# Altium footprint library std-th.PcbLib: 245 footprints (part 16 of 16)
Each footprint in its own frame and in the unit in brackets; x right, y up, seen from the top. Pads: shape width x height; smd on the part's side, far side on the other; paste and mask are expansions set on the pad; w line width, h text height; cw(c..) or ccw(c..) is an arc to the next point about the centre after c.
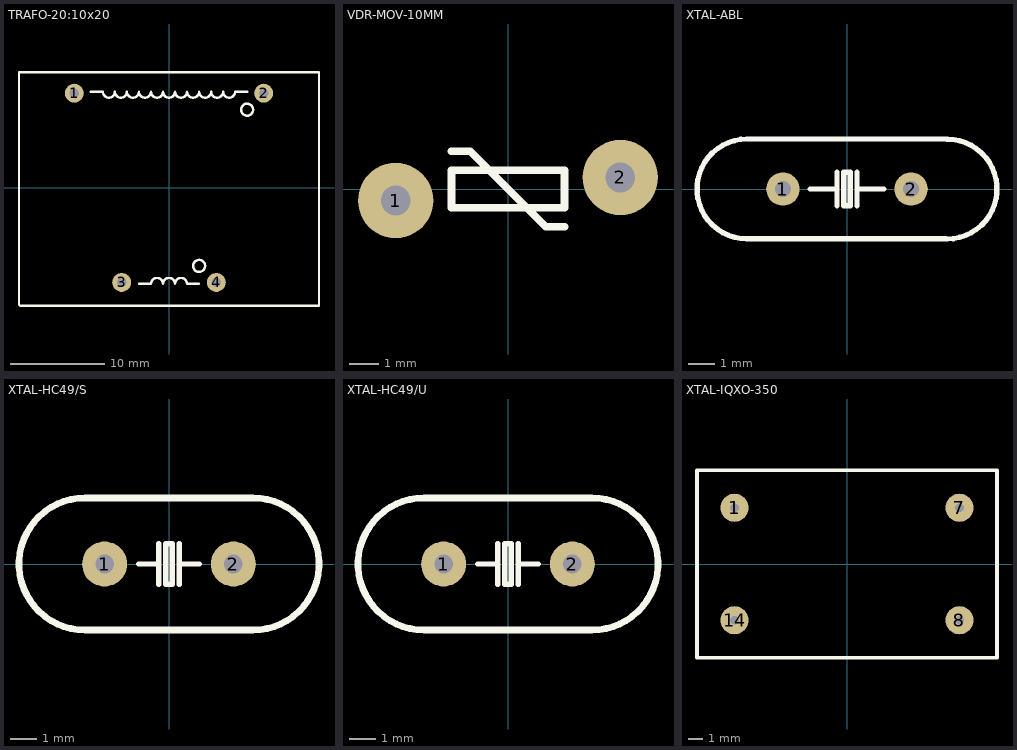
[diagram p15: the footprints below, top view; thin cyan lines are the x and y axes]

## TRAFO-20:10x20 [mm] "Transformer, body 31.7 x 26.7 x 21.8 mm, prim leads 20 mm; sec leads 10 mm; 20 mm spacing"
height 32.8
pads (4):
  round 2 hole 1: 1(-10,10) 2(10,10) 3(-5,-10) 4(5,-10)
Top Overlay:
  circle w0.254: c8.255,8.255 r0.635
  circle w0.254: c3.175,-8.255 r0.635
  lines w0.254: -15.85,-12.344 -15.85,12.192 15.85,12.192 15.85,-12.446 ; -15.748,-12.446 15.748,-12.446 ; -8.255,10.16 -6.985,10.16 ccw(c-6.35,10.16) -5.715,10.16 ccw(c-5.08,10.16) -4.445,10.16 ccw(c-3.81,10.16) -3.175,10.16 ccw(c-2.54,10.16) -1.905,10.16 ccw(c-1.27,10.16) -0.635,10.16 ccw(c0,10.16) 0.635,10.16 ccw(c1.27,10.16) 1.905,10.16 ccw(c2.54,10.16) 3.175,10.16 ccw(c3.81,10.16) 4.445,10.16 ccw(c5.08,10.16) 5.715,10.16 ccw(c6.35,10.16) 6.985,10.16 8.255,10.16 ; -3.175,-10.16 -1.905,-10.16 cw(c-1.27,-10.16) -0.635,-10.16 cw(c0,-10.16) 0.635,-10.16 cw(c1.27,-10.16) 1.905,-10.16 3.175,-10.16
3D body: height 23.7, standoff -5, extent -16.244,-13.716 16.256,13.784

## VDR-MOV-10MM [mm] "MOV VDR 10 mm"
height 12
pads (2):
  round 2.54 hole 1: 1(-3.788,-0.39) 2(3.788,0.39)
Top Overlay:
  lines w0.254: -1.905,1.27 -1.27,1.27 1.27,-1.27 1.905,-1.27 ; -1.905,-0.635 -1.905,0.635 1.905,0.635 1.905,-0.635 -1.905,-0.635
3D body: height 15.84, standoff -2.66, extent -5.746,-0.86 5.538,0.99

## XTAL-ABL [mm] "Crystal, Through Hole, 10.3 x 3.8 mm body, 4.88 mm pitch"
height 3.5
pads (2):
  round 1.27 hole 0.6: 1(-2.44,0) 2(2.44,0)
Top Overlay:
  lines w0.203: -1.397,0 -0.381,0 -0.381,-0.635 -0.381,0.635 ; 0.381,-0.635 0.381,0.635 ; 0.381,0 1.397,0 ; 3.765,-1.895 -3.81,-1.895 cw(c-3.81,0.005) -3.81,1.905 3.775,1.905 ; 3.81,-1.9 ccw(c3.81,0) 3.81,1.9 ; -0.127,-0.635 0.127,-0.635 0.127,0.635 -0.127,0.635 -0.127,-0.635
3D body: height 3.5, standoff -4, extent -5.675,-2.286 5.675,2.364

## XTAL-HC49/S [mm] "Crystal, HC49/S, 192 mil pitch"
height 3.81
pads (2):
  round 1.7 hole 0.7: 1(-2.438,0) 2(2.438,0)
Top Overlay:
  lines w0.203: -1.143,0 -0.381,0 ; -0.381,-0.762 -0.381,0.762 ; 0.381,-0.762 0.381,0.762 ; 0.381,0 1.143,0 ; -0.127,-0.762 0.127,-0.762 0.127,0.762 -0.127,0.762 -0.127,-0.762
  lines w0.254: -3.175,-2.5 cw(c-3.175,0) -3.175,2.5 3.175,2.5 cw(c3.175,0) 3.175,-2.5 -3.175,-2.5
3D body: height 3.6, standoff -3, extent -5.488,-2.245 5.492,2.246

## XTAL-HC49/U [mm] "Crystal, HC49/U, 192 mil pitch"
height 13.462
pads (2):
  round 1.7 hole 0.7: 1(-2.438,0) 2(2.438,0)
Top Overlay:
  lines w0.203: -1.143,0 -0.381,0 ; -0.381,-0.762 -0.381,0.762 ; 0.381,-0.762 0.381,0.762 ; 0.381,0 1.143,0 ; -0.127,-0.762 -0.127,0.762 0.127,0.762 0.127,-0.762 -0.127,-0.762
  lines w0.254: -3.175,-2.5 cw(c-3.175,0) -3.175,2.5 3.175,2.5 cw(c3.175,0) 3.175,-2.5 -3.175,-2.5
3D body: height 13.2, standoff -2, extent -5.499,-2.25 5.499,2.25

## XTAL-IQXO-350 [mm] "Oscillator"
pads (4):
  round 1.905 hole 0.6: 1(-7.62,3.81) 7(7.62,3.81) 8(7.62,-3.81) 14(-7.62,-3.81)
Top Overlay:
  lines w0.254: -10.16,-6.35 10.16,-6.35 10.16,6.35 -10.16,6.35 -10.16,-6.35
3D body: height 5.41, standoff -5.79, extent -10.125,-6.3 10.125,6.3